# Altium footprint library THU VIEN PCB.PCBLib: 911 footprints (part 6 of 57)
Each footprint in its own frame and in the unit in brackets; x right, y up, seen from the top. Pads: shape width x height; smd on the part's side, far side on the other; paste and mask are expansions set on the pad; w line width, h text height; cw(c..) or ccw(c..) is an arc to the next point about the centre after c.
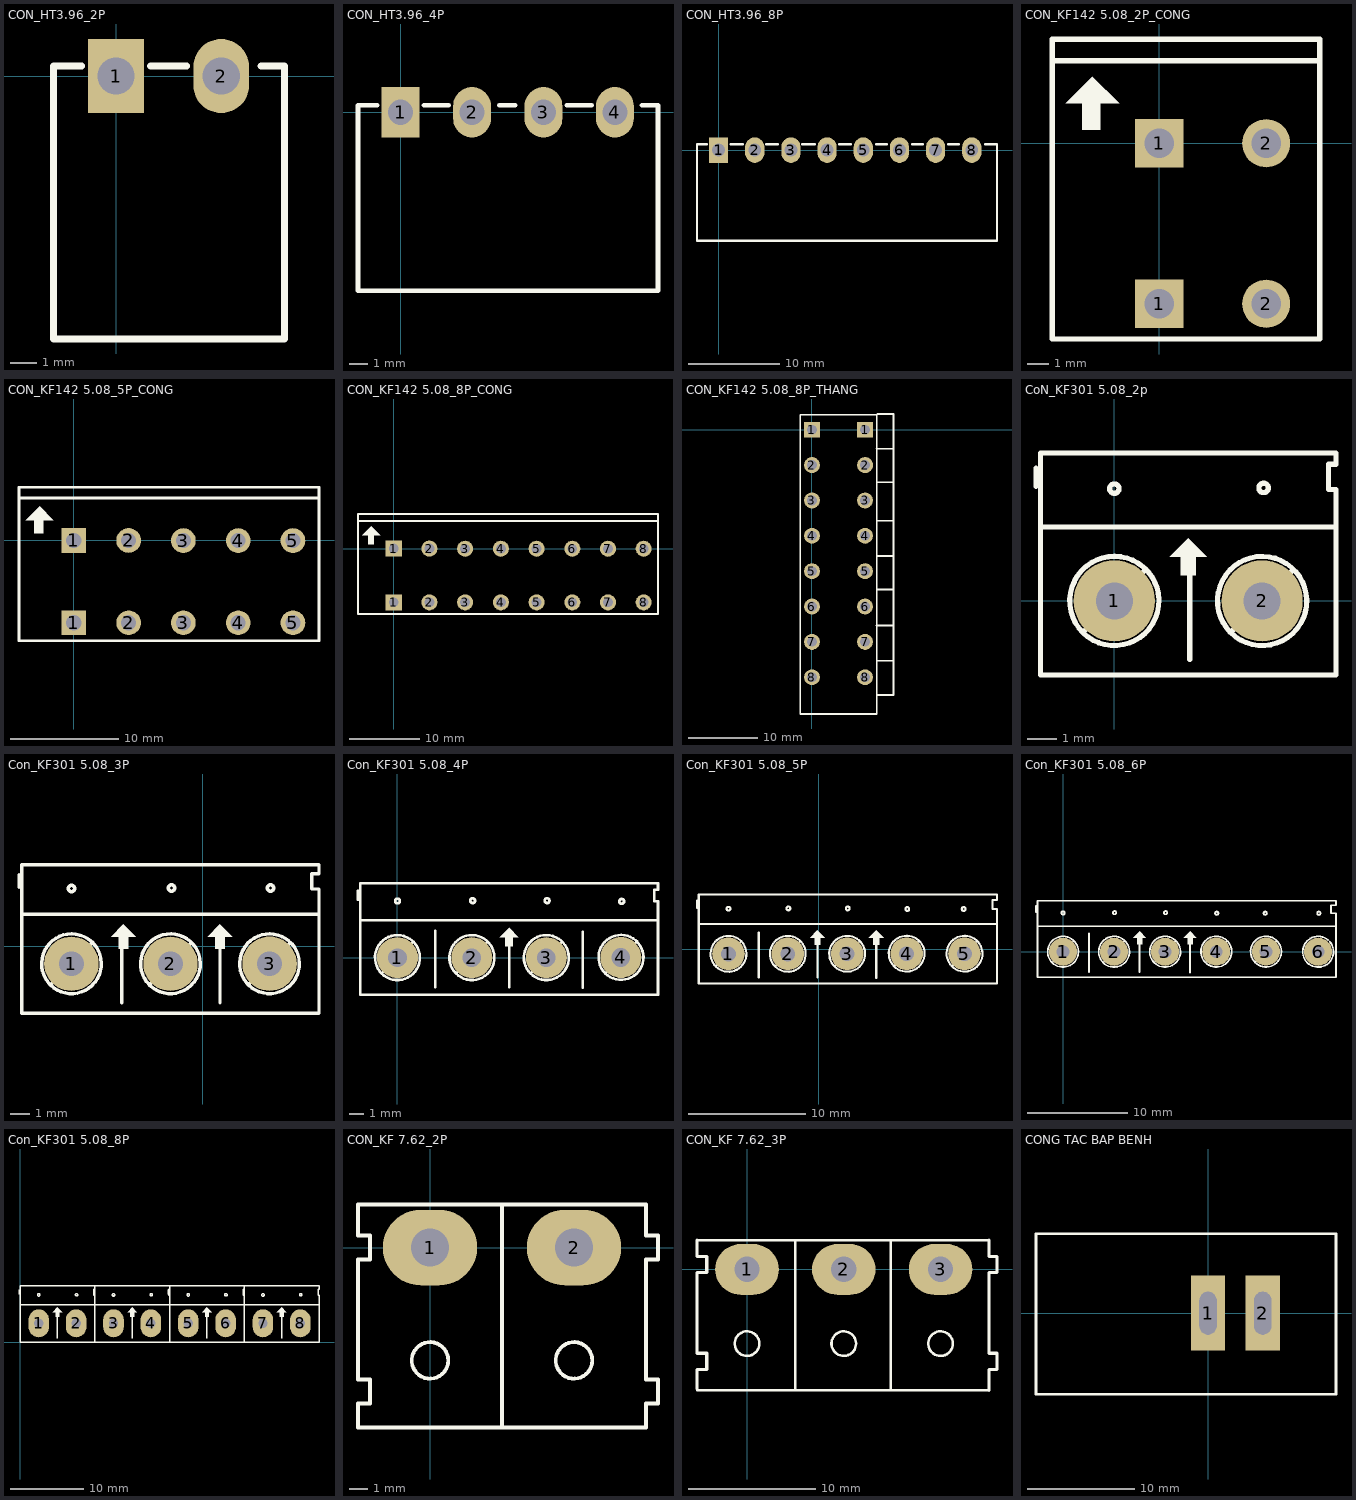
[diagram p5: the footprints below, top view; thin cyan lines are the x and y axes]

## CON_HT3.96_2P [mm]
pads (2):
  rect 2.1x2.794 hole 1.4: 1(0,0)
  oval 2.1x2.794 hole 1.4: 2(3.96,0)
Top Overlay:
  lines w0.254: -1.295,0.381 -2.286,0.381 -2.362,0.381 -2.362,-9.906 6.35,-9.906 6.35,0.381 5.461,0.381 ; 1.295,0.381 2.667,0.381
3D body "Con 2 KF396.stp": height 7.02, standoff 0.02, extent -1.968,-10 6.032,0

## CON_HT3.96_4P [mm]
pads (4):
  rect 2.1x2.794 hole 1.4: 1(0,0)
  oval 2.1x2.794 hole 1.4: 2(3.96,0) 3(7.92,0) 4(11.88,0)
Top Overlay:
  lines w0.254: -1.295,0.381 -2.286,0.381 -2.362,0.381 -2.362,-9.906 6.35,-9.906 ; 1.295,0.381 2.667,0.381 ; 5.461,0.381 6.35,0.381 ; 5.558,-9.906 14.27,-9.906 14.27,0.381 13.381,0.381 ; 5.558,0.381 5.634,0.381 ; 9.215,0.381 10.587,0.381
3D body "Con 2 KF396.stp": height 7.02, standoff 0.02, extent -1.968,-10 6.032,0
3D body "Con 2 KF396.stp": height 7.02, standoff 0.02, extent 5.952,-10 13.952,0

## CON_HT3.96_8P [mm]
pads (8):
  rect 2.1x2.794 hole 1.4: 1(0,0)
  oval 2.1x2.794 hole 1.4: 2(3.96,0) 3(7.92,0) 4(11.88,0) 5(15.84,0) 6(19.8,0) 7(23.76,0) 8(27.72,0)
Top Overlay:
  lines w0.254: -1.295,0.635 -2.362,0.635 -2.362,-9.906 30.48,-9.906 30.48,0.381 ; 1.295,0.635 2.667,0.635 ; 5.207,0.635 6.477,0.635 ; 9.144,0.635 10.541,0.635 ; 13.208,0.635 14.478,0.635 ; 17.272,0.635 18.415,0.635 ; 21.209,0.635 22.352,0.635 ; 25.146,0.635 26.289,0.635 ; 29.21,0.635 30.48,0.635 30.48,0.254
3D body "Con 2 KF396.stp": height 7.02, standoff 0.02, extent 22.219,-10.025 30.219,-0.025
3D body "Con 2 KF396.stp": height 7.02, standoff 0.02, extent 14.161,-10.025 22.161,-0.025
3D body "Con 2 KF396.stp": height 7.02, standoff 0.02, extent 6.122,-10.025 14.122,-0.025
3D body "Con 2 KF396.stp": height 7.02, standoff 0.02, extent -1.968,-10.025 6.032,-0.025

## CON_KF142 5.08_2P_CONG [mil]
pads (4):
  rect 90x90 hole 55.12: 1(0,-300.39) 1(0,0)
  round 90 hole 55.12: 2(200,-300.39) 2(200,0)
Top Overlay:
  rectangle: -145,24.61 -110,74.61
  region: -175,74.61 -125,124.61 -75,74.61
  lines w10: -200,64.61 -200,154.61 ; -200,65.61 -200,-366.39 300,-366.39 ; 300,-365 300,195 ; 300,154.61 -200,154.61 ; 300,194.61 -200,194.61 -200,154.61
3D body "Terminal Blocks Fixed SPRING 2PIN CONG.stp": height 520.69, standoff -137.32, extent -205,-375.35 293.43,185.35

## CON_KF142 5.08_5P_CONG [mil]
pads (10):
  rect 90x90 hole 55.12: 1(0,-300.39) 1(0,0)
  round 90 hole 55.12: 2(200,-300.39) 2(200,0) 3(400,-300.39) 3(400,-0.39) 4(600,-300.39) 4(600,-0.39) 5(800,-300.39) 5(800,-0.39)
Top Overlay:
  rectangle: -145,24.61 -110,74.61
  region: -175,74.61 -125,124.61 -75,74.61
  lines w10: -200,64.61 -200,154.61 ; -200,65.61 -200,-366.39 895,-366.39 ; 890,154.61 -200,154.61 ; 895,-365 895,190 ; 895,194.61 -200,194.61 -200,154.61
3D body "Terminal Blocks Fixed SPRING 5PIN.stp": height 520.69, standoff -137.32, extent -194.21,-370 904.21,190.69

## CON_KF142 5.08_8P_CONG [mil]
pads (16):
  rect 90x90 hole 55.12: 1(0,-300.39) 1(0,0)
  round 90 hole 55.12: 2(200,-300.39) 2(200,0) 3(400,-300.39) 3(400,-0.39) 4(600,-300.39) 4(600,-0.39) 5(800,-300.39) 5(800,-0.39) 6(1000,-300.39) 6(1000,-0.39) 7(1200,-300.39) 7(1200,-0.39) 8(1400,-300.39) 8(1400,-0.39)
Top Overlay:
  rectangle: -145,24.61 -110,74.61
  region: -175,74.61 -125,124.61 -75,74.61
  lines w10: -200,64.61 -200,154.61 ; -200,65.61 -200,-366.39 1480,-366.39 1480,65.61 ; 1480,64.61 1480,154.61 -200,154.61 ; 1480,159.61 1480,194.61 -200,194.61 -200,154.61
3D body "Terminal Blocks Fixed SPRING 8PIN.stp": height 520.71, standoff -137.64, extent -193.23,-370.94 1480,190.15

## CON_KF142 5.08_8P_THANG [mil]
pads (16):
  rect 90x90 hole 55.12: 1(0,0) 1(300.39,0)
  round 90 hole 55.12: 2(0,-200) 2(300.39,-200) 3(0,-400) 3(300,-400) 4(0,-600) 4(300,-600) 5(0,-800) 5(300,-800) 6(0,-1000) 6(300,-1000) 7(0,-1200) 7(300,-1200) 8(0,-1400) 8(300,-1400)
Top Overlay:
  lines w10: 364,-108 460,-108 ; 365,-1107 459,-1107 ; 367,-1500 461,-1500 461,89 369,89 ; 367,-1307 462,-1307 ; 367,-904 458,-904 ; 367,-297 460,-297 ; 368,-714 462,-714 ; 371,-515 459,-515 ; -66,-1608 366,-1608 366,85 -66,85 -66,-1608
3D body "Con 8 KF 142 5.08 Thang.stp": height 559.66, standoff -154.91, extent -61.83,-1609.43 457.83,89

## CoN_KF301 5.08_2p [mil]
pads (2):
  round 110 hole 50: 1(0,0) 2(200,0)
Top Overlay:
  circle w7: c0,152 r6.4
  circle w7: c202,153 r6.4
  region: 100,85 75,60 90,60 90,35 110,35 110,60 125,60
  lines w7: -106,155 -106,180 ; -100,100 300,100 ; -42,-42 43,43 ; 39.04,46.05 ccw(c0,0) 45.18,40.05 ; 102,-79 102,72 ; 158,-42 242.5,42.5 ; 239.76,45.44 ccw(c200,0) 245.18,40.05 ; 290,182 290,151 300,151 300,-100 -100,-100 -100,50 -100,200 300,200 300,185 290,185 ; 300,-79 300,40
3D body "Con 2 KF301.stp": height 335.25, standoff -137.19, extent -45,-97.4 255,190

## Con_KF301 5.08_3P [mil]
pads (3):
  round 110 hole 50: 1(-265,-35) 2(-65,-35) 3(135.06,-34.94)
Top Overlay:
  circle w7: c-63,118 r6.4
  circle w7: c-265,117 r6.4
  circle w7: c137,118 r6.4
  region: 35,45 10,20 25,20 25,-5 45,-5 45,20 60,20
  region: -160,45 -185,20 -170,20 -170,-5 -150,-5 -150,20 -135,20
  lines w7: -371,120 -371,145 ; -365,65 230,65 ; -307,-77 -222,8 ; -225.96,11.05 ccw(c-265,-35) -219.82,5.05 ; -163,-114 -163,37 ; -107,-77 -22.5,7.5 ; -25.24,10.44 ccw(c-65,-35) -19.82,5.05 ; 35,-114 35,5 ; 93.5,-76.5 177.5,7.5 ; 174.27,10.97 ccw(c135.06,-34.94) 180.19,5.17 ; -365,-135 -365,15 -365,165 235,165 235,147 220,147 220,116 235,116 235,-135 -365,-135

## Con_KF301 5.08_4P [mil]
pads (4):
  round 110 hole 50: 1(0,0) 2(200,0) 3(400.06,0.06) 4(600.39,0.39)
Top Overlay:
  circle w7: c602.6,151 r6.4
  circle w7: c402,153 r6.4
  circle w7: c0,152 r6.4
  circle w7: c202,153 r6.4
  region: 300,80 275,55 290,55 290,30 310,30 310,55 325,55
  lines w7: -106,155 -106,180 ; -100,100 700,100 ; -42,-42 43,43 ; 39.04,46.05 ccw(c0,0) 45.18,40.05 ; 102,-79 102,72 ; 158,-42 242.5,42.5 ; 239.76,45.44 ccw(c200,0) 245.18,40.05 ; 300,-79 300,40 ; 358.5,-41.5 442.5,42.5 ; 439.27,45.97 ccw(c400.06,0.06) 445.19,40.17 ; 497.97,-81.03 497.97,69.97 ; 559,-41 643.5,43.5 ; 640.16,46.18 ccw(c600.59,0.59) 646.12,40.23 ; -100,-100 700,-100 700,151 690,151 690,182 700,182 700,200 -100,200 -100,50 -100,-100
3D body "terminal_blocks_a-tb500-ta04.stp": height 496.57, standoff -145.15, extent -115.51,-156 695.51,198.33

## Con_KF301 5.08_5P [mil]
pads (5):
  round 110 hole 50: 1(-305,-15) 2(-105,-15) 3(95.06,-14.94) 4(295.39,-14.61) 5(490.39,-14.61)
Top Overlay:
  circle w7: c297.6,136 r6.4
  circle w7: c97,138 r6.4
  circle w7: c-305,137 r6.4
  circle w7: c-103,138 r6.4
  circle w7: c487.6,136 r6.4
  region: -5,65 -30,40 -15,40 -15,15 5,15 5,40 20,40
  region: 193,65 168,40 183,40 183,15 203,15 203,40 218,40
  lines w7: -411,140 -411,165 ; -405,85 600,85 ; -347,-57 -262,28 ; -265.96,31.05 ccw(c-305,-15) -259.82,25.05 ; -203,-94 -203,57 ; -147,-57 -62.5,27.5 ; -65.24,30.44 ccw(c-105,-15) -59.82,25.05 ; -5,-94 -5,25 ; 53.5,-56.5 137.5,27.5 ; 134.27,30.97 ccw(c95.06,-14.94) 140.19,25.17 ; 192.97,-96.03 192.97,54.97 ; 254,-56 338.5,28.5 ; 335.16,31.18 ccw(c295.59,-14.41) 341.12,25.23 ; 449,-56 533.5,28.5 ; 530.16,31.18 ccw(c490.59,-14.41) 536.12,25.23 ; -405,-115 600,-115 600,136 585,136 585,167 600,167 600,185 -405,185 -405,35 -405,-115

## Con_KF301 5.08_6P [mil]
pads (6):
  round 110 hole 50: 1(0,0) 2(200,0) 3(400.06,0.06) 4(600.39,0.39) 5(795.39,0.39) 6(1000,0)
Top Overlay:
  circle w7: c1002.6,151 r6.4
  circle w7: c792.6,151 r6.4
  circle w7: c202,153 r6.4
  circle w7: c0,152 r6.4
  circle w7: c402,153 r6.4
  circle w7: c602.6,151 r6.4
  region: 498,80 473,55 488,55 488,30 508,30 508,55 523,55
  region: 300,80 275,55 290,55 290,30 310,30 310,55 325,55
  lines w7: -106,155 -106,180 ; -100,100 1070,100 ; -42,-42 43,43 ; 39.04,46.05 ccw(c0,0) 45.18,40.05 ; 102,-79 102,72 ; 158,-42 242.5,42.5 ; 239.76,45.44 ccw(c200,0) 245.18,40.05 ; 300,-79 300,40 ; 358.5,-41.5 442.5,42.5 ; 439.27,45.97 ccw(c400.06,0.06) 445.19,40.17 ; 497.97,-81.03 497.97,69.97 ; 559,-41 643.5,43.5 ; 640.16,46.18 ccw(c600.59,0.59) 646.12,40.23 ; 754,-41 838.5,43.5 ; 835.16,46.18 ccw(c795.59,0.59) 841.12,40.23 ; 1039.57,45.6 ccw(c1000,0) 1045.53,39.65 ; -100,-100 -100,50 -100,200 1070,200 1070,182 1050,182 1050,151 1070,151 1070,-100 -100,-100
3D body "SW3dPS-KRM2.STEP": height 393.7, standoff -157.48, extent -96.85,-100 296.85,195.28
3D body "SW3dPS-KRM2.STEP": height 393.7, standoff -157.48, extent 293.15,-100 686.85,195.28
3D body "SW3dPS-KRM2.STEP": height 393.7, standoff -157.48, extent 683.15,-100 1076.85,195.28

## Con_KF301 5.08_8P [mil]
pads (8):
  oval 110x149.61 hole 50: 1(100,100) 2(300,100) 3(500,100) 4(700,100) 5(900,100) 6(1100,100) 7(1300,100) 8(1500,100)
Top Overlay:
  circle w7: c1300,252 r6.4
  circle w7: c1502,253 r6.4
  circle w7: c1102,253 r6.4
  circle w7: c900,252 r6.4
  circle w7: c702,253 r6.4
  circle w7: c500,252 r6.4
  circle w7: c302,253 r6.4
  circle w7: c100,252 r6.4
  region: 1400,185 1375,160 1390,160 1390,135 1410,135 1410,160 1425,160
  region: 1000,185 975,160 990,160 990,135 1010,135 1010,160 1025,160
  region: 600,185 575,160 590,160 590,135 610,135 610,160 625,160
  region: 200,185 175,160 190,160 190,135 210,135 210,160 225,160
  lines w7: -6,255 -6,280 ; 2,200 399,200 ; 200,21 200,172 ; 394,255 394,280 ; 402,200 799,200 ; 600,21 600,172 ; 794,255 794,280 ; 802,200 1199,200 ; 1000,21 1000,172 ; 1194,255 1194,280 ; 1202,200 1599,200 ; 1400,21 1400,172 ; 400,0 400,150 400,300 ; 400,0 800,0 ; 400,0 400,251 395,251 395,282 400,282 400,300 ; 400,0 0,0 0,150 0,300 400,300 ; 400,300 800,300 ; 800,0 800,150 800,300 ; 800,0 1200,0 ; 800,0 800,251 795,251 795,282 800,282 800,300 ; 800,300 1200,300 ; 1200,0 1600,0 1600,251 1595,251 1595,282 1600,282 1600,300 1200,300 ; 1200,0 1200,150 1200,300 ; 1200,0 1200,251 1195,251 1195,282 1200,282 1200,300
3D body "SW3dPS-KRM2.STEP": height 393.7, standoff -157.48, extent 1203.15,2.36 1596.85,297.64
3D body "SW3dPS-KRM2.STEP": height 393.7, standoff -157.48, extent 803.15,2.36 1196.85,297.64
3D body "SW3dPS-KRM2.STEP": height 393.7, standoff -157.48, extent 403.15,2.36 796.85,297.64
3D body "SW3dPS-KRM2.STEP": height 393.7, standoff -157.48, extent 3.15,2.36 396.85,297.64

## CON_KF 7.62_2P [mm]
pads (2):
  oval 5x4 hole 2: 1(0,0) 2(7.62,0)
Top Overlay:
  circle w0.203: c7.62,-5.969 r0.967
  circle w0.203: c0,-5.969 r0.967
  lines w0.2: -3.81,-9.525 -3.81,-8.255 -3.175,-8.255 -3.175,-6.985 -3.81,-6.985 -3.81,-0.635 -3.175,-0.635 -3.175,0.635 -3.81,0.635 -3.81,2.286 11.43,2.286 11.43,0.635 12.065,0.635 12.065,-0.635 11.43,-0.635 11.43,-6.985 12.065,-6.985 12.065,-8.255 11.43,-8.255 11.43,-9.525 ; -3.81,-9.517 11.43,-9.517 ; 3.81,-9.527 3.81,2.286

## CON_KF 7.62_3P [mm]
pads (3):
  oval 5x4 hole 2: 1(0,0) 2(7.62,0) 3(15.24,0)
Top Overlay:
  circle w0.203: c0,-5.842 r0.967
  circle w0.203: c7.62,-5.842 r0.967
  circle w0.203: c15.24,-5.842 r0.967
  lines w0.2: -3.937,2.286 11.687,2.286 19.05,2.286 ; -3.925,-9.38 -3.925,-9.525 19.05,-9.525 ; 3.81,-9.4 3.81,2.286 ; 11.303,2.159 11.31,-9.4
  lines w0.254: -3.937,-9.398 -3.937,-7.874 -3.175,-7.874 -3.175,-6.604 -3.937,-6.604 -3.937,-0.254 -3.175,-0.254 -3.175,1.016 -3.937,1.016 -3.937,2.286 ; 19.05,-9.525 19.05,-7.874 19.685,-7.874 19.685,-6.604 19.05,-6.604 19.05,-0.254 19.685,-0.254 19.685,1.016 19.05,1.016 19.05,2.286

## CONG TAC BAP BENH [mm]
pads (2):
  rect 3.2x7 hole 1.6 slot 4 at 90 deg: 1(0,0) 2(5.105,0)
Top Overlay:
  lines w0.254: 11.913,7.417 -16.053,7.417 -16.053,-7.569 11.938,-7.569 11.938,7.417